# Altium footprint library IDC座子10-64PIN.PcbLib: 24 footprints (part 2 of 2)
Each footprint in its own frame and in the unit in brackets; x right, y up, seen from the top. Pads: shape width x height; smd on the part's side, far side on the other; paste and mask are expansions set on the pad; w line width, h text height; cw(c..) or ccw(c..) is an arc to the next point about the centre after c.
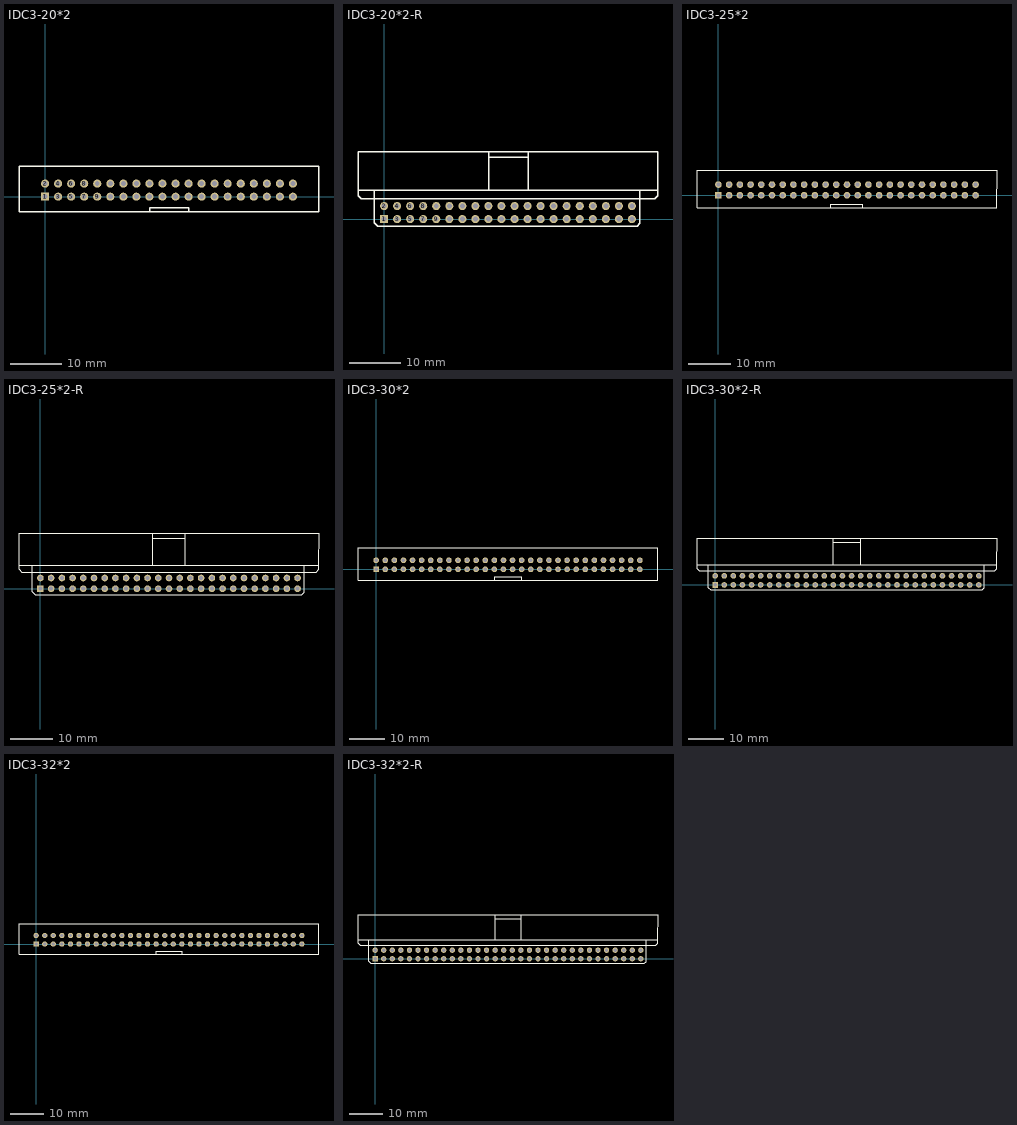
[diagram p1: the footprints below, top view; thin cyan lines are the x and y axes]

## IDC3-20*2 [mil]
pads (40):
  rect 62x62 hole 38: 1(0,0)
  round 62 hole 38: 2(0,100) 3(100,0) 4(100,100) 5(200,0) 6(200,100) 7(300,0) 8(300,100) 9(400,0) 10(400,100) 11(500,0) 12(500,100) 13(600,0) 14(600,100) 15(700,0) 16(700,100) 17(800,0) 18(800,100) 19(900,0) 20(900,100) 21(1000,0) 22(1000,100) 23(1100,0) 24(1100,100) 25(1200,0) 26(1200,100) 27(1300,0) 28(1300,100) 29(1400,0) 30(1400,100) 31(1500,0) 32(1500,100) 33(1600,0) 34(1600,100) 35(1700,0) 36(1700,100) 37(1800,0) 38(1800,100) 39(1900,0) 40(1900,100)
TopOverlay:
  lines w10: 802.76,-116.65 802.76,-85.63 1102.76,-85.63 1102.76,-116.65 ; -200,-117.13 -200,235.24 2100,235.24 2100,-117.13 -200,-117.13
3D body "BH-40.STEP": height 354.33, standoff -133.86, extent -196.97,-117.17 2102.24,237.16

## IDC3-20*2-R [mil]
pads (40):
  rect 62x62 hole 38: 1(0,0)
  round 62 hole 38: 2(0,100) 3(100,0) 4(100,100) 5(200,0) 6(200,100) 7(300,0) 8(300,100) 9(400,0) 10(400,100) 11(500,0) 12(500,100) 13(600,0) 14(600,100) 15(700,0) 16(700,100) 17(800,0) 18(800,100) 19(900,0) 20(900,100) 21(1000,0) 22(1000,100) 23(1100,0) 24(1100,100) 25(1200,0) 26(1200,100) 27(1300,0) 28(1300,100) 29(1400,0) 30(1400,100) 31(1500,0) 32(1500,100) 33(1600,0) 34(1600,100) 35(1700,0) 36(1700,100) 37(1800,0) 38(1800,100) 39(1900,0) 40(1900,100)
TopOverlay:
  lines w8: -76.12,220 -75,218.88
  lines w10: -75,218.88 -75,-30 -50,-55 1940,-55 1961.88,-33.12 1961.88,220 ; 803.74,225.37 803.74,474.41 ; 803.74,515.42 803.74,474.41 ; 1103.74,223.55 1103.74,472.44 ; 1103.74,514.76 1103.74,472.44 ; -200,220 2100,220 ; -200,220 -200,515.75 2100,515.75 2100,220 ; -200,220 -200,180 -175,155 -75,155 961.88,155 2075,155 2100,180 2100,220 ; 803.74,474.41 803.74,472.44 1103.74,472.44
3D body "BH-40R.STEP": height 358.27, standoff -110.24, extent -200,-18.11 2099.21,515.75

## IDC3-25*2 [mil]
pads (50):
  rect 62x62 hole 38: 1(0,0)
  round 62 hole 38: 2(0,100) 3(100,0) 4(100,100) 5(200,0) 6(200,100) 7(300,0) 8(300,100) 9(400,0) 10(400,100) 11(500,0) 12(500,100) 13(600,0) 14(600,100) 15(700,0) 16(700,100) 17(800,0) 18(800,100) 19(900,0) 20(900,100) 21(1000,0) 22(1000,100) 23(1100,0) 24(1100,100) 25(1200,0) 26(1200,100) 27(1300,0) 28(1300,100) 29(1400,0) 30(1400,100) 31(1500,0) 32(1500,100) 33(1600,0) 34(1600,100) 35(1700,0) 36(1700,100) 37(1800,0) 38(1800,100) 39(1900,0) 40(1900,100) 41(2000,0) 42(2000,100) 43(2100,0) 44(2100,100) 45(2200,0) 46(2200,100) 47(2300,0) 48(2300,100) 49(2400,0) 50(2400,100)
TopOverlay:
  lines w10: 1048.82,-114.69 1048.82,-83.66 1348.82,-83.66 1348.82,-114.68 ; -200,-117.13 2600,-117.13 2600,235.24 -200,235.24 -200,-117.13
3D body "BH-50.STEP": height 354.33, standoff -133.86, extent -200.78,-117.13 2598.43,237.2

## IDC3-25*2-R [mil]
pads (50):
  rect 62x62 hole 38: 1(0,0)
  round 62 hole 38: 2(0,100) 3(100,0) 4(100,100) 5(200,0) 6(200,100) 7(300,0) 8(300,100) 9(400,0) 10(400,100) 11(500,0) 12(500,100) 13(600,0) 14(600,100) 15(700,0) 16(700,100) 17(800,0) 18(800,100) 19(900,0) 20(900,100) 21(1000,0) 22(1000,100) 23(1100,0) 24(1100,100) 25(1200,0) 26(1200,100) 27(1300,0) 28(1300,100) 29(1400,0) 30(1400,100) 31(1500,0) 32(1500,100) 33(1600,0) 34(1600,100) 35(1700,0) 36(1700,100) 37(1800,0) 38(1800,100) 39(1900,0) 40(1900,100) 41(2000,0) 42(2000,100) 43(2100,0) 44(2100,100) 45(2200,0) 46(2200,100) 47(2300,0) 48(2300,100) 49(2400,0) 50(2400,100)
TopOverlay:
  lines w8: -76.12,220 -75,218.88
  lines w10: -75,218.88 -75,-30 -50,-55 2440,-55 2461.88,-33.12 2461.88,220 ; 1050,223.4 1050,472.44 ; 1050,513.45 1050,472.44 ; 1350,221.58 1350,470.47 ; 1350,512.8 1350,470.47 ; -200,220 2600,220 ; -200,220 -200,515.75 2600,515.75 2600,220 ; -200,220 -200,180 -175,155 -75,155 961.88,155 2575,155 2600,180 2600,220 ; 1050,472.44 1050,470.47 1350,470.47
3D body "BH-50R.STEP": height 358.27, standoff -110.24, extent -199.21,-18.11 2600,515.75

## IDC3-30*2 [mil]
pads (60):
  rect 62x62 hole 38: 1(0,0)
  round 62 hole 38: 2(0,100) 3(100,0) 4(100,100) 5(200,0) 6(200,100) 7(300,0) 8(300,100) 9(400,0) 10(400,100) 11(500,0) 12(500,100) 13(600,0) 14(600,100) 15(700,0) 16(700,100) 17(800,0) 18(800,100) 19(900,0) 20(900,100) 21(1000,0) 22(1000,100) 23(1100,0) 24(1100,100) 25(1200,0) 26(1200,100) 27(1300,0) 28(1300,100) 29(1400,0) 30(1400,100) 31(1500,0) 32(1500,100) 33(1600,0) 34(1600,100) 35(1700,0) 36(1700,100) 37(1800,0) 38(1800,100) 39(1900,0) 40(1900,100) 41(2000,0) 42(2000,100) 43(2100,0) 44(2100,100) 45(2200,0) 46(2200,100) 47(2300,0) 48(2300,100) 49(2400,0) 50(2400,100) 51(2500,0) 52(2500,100) 53(2600,0) 54(2600,100) 55(2700,0) 56(2700,100) 57(2800,0) 58(2800,100) 59(2900,0) 60(2900,100)
TopOverlay:
  lines w10: 1303.59,-114.39 1303.59,-83.37 1603.59,-83.37 1603.59,-114.39 ; -200,-117.13 3100,-117.13 3100,235.24 -200,235.24 -200,-117.13
3D body "BH-60.STEP": height 354.33, standoff -133.86, extent -199.21,-117.13 3100,237.2

## IDC3-30*2-R [mil]
pads (60):
  rect 62x62 hole 38: 1(0,0)
  round 62 hole 38: 2(0,100) 3(100,0) 4(100,100) 5(200,0) 6(200,100) 7(300,0) 8(300,100) 9(400,0) 10(400,100) 11(500,0) 12(500,100) 13(600,0) 14(600,100) 15(700,0) 16(700,100) 17(800,0) 18(800,100) 19(900,0) 20(900,100) 21(1000,0) 22(1000,100) 23(1100,0) 24(1100,100) 25(1200,0) 26(1200,100) 27(1300,0) 28(1300,100) 29(1400,0) 30(1400,100) 31(1500,0) 32(1500,100) 33(1600,0) 34(1600,100) 35(1700,0) 36(1700,100) 37(1800,0) 38(1800,100) 39(1900,0) 40(1900,100) 41(2000,0) 42(2000,100) 43(2100,0) 44(2100,100) 45(2200,0) 46(2200,100) 47(2300,0) 48(2300,100) 49(2400,0) 50(2400,100) 51(2500,0) 52(2500,100) 53(2600,0) 54(2600,100) 55(2700,0) 56(2700,100) 57(2800,0) 58(2800,100) 59(2900,0) 60(2900,100)
TopOverlay:
  lines w8: -76.12,220 -75,218.88
  lines w10: -75,218.88 -75,-30 -50,-55 2940,-55 2961.88,-33.12 2961.88,220 ; 1300.79,224.39 1300.79,473.43 ; 1300.79,514.43 1300.79,473.43 ; 1600.79,222.56 1600.79,471.46 ; 1600.79,513.78 1600.79,471.46 ; -200,220 3100,220 ; -200,220 -200,515.75 3100,515.75 3100,220 ; -200,220 -200,180 -175,155 -75,155 961.88,155 3075,155 3100,180 3100,220 ; 1300.79,473.43 1300.79,471.46 1600.79,471.46
3D body "BH-60R.STEP": height 358.27, standoff -110.24, extent -199.21,-18.11 3100,515.75

## IDC3-32*2 [mil]
pads (64):
  rect 62x62 hole 38: 1(0,0)
  round 62 hole 38: 2(0,100) 3(100,0) 4(100,100) 5(200,0) 6(200,100) 7(300,0) 8(300,100) 9(400,0) 10(400,100) 11(500,0) 12(500,100) 13(600,0) 14(600,100) 15(700,0) 16(700,100) 17(800,0) 18(800,100) 19(900,0) 20(900,100) 21(1000,0) 22(1000,100) 23(1100,0) 24(1100,100) 25(1200,0) 26(1200,100) 27(1300,0) 28(1300,100) 29(1400,0) 30(1400,100) 31(1500,0) 32(1500,100) 33(1600,0) 34(1600,100) 35(1700,0) 36(1700,100) 37(1800,0) 38(1800,100) 39(1900,0) 40(1900,100) 41(2000,0) 42(2000,100) 43(2100,0) 44(2100,100) 45(2200,0) 46(2200,100) 47(2300,0) 48(2300,100) 49(2400,0) 50(2400,100) 51(2500,0) 52(2500,100) 53(2600,0) 54(2600,100) 55(2700,0) 56(2700,100) 57(2800,0) 58(2800,100) 59(2900,0) 60(2900,100) 61(3000,0) 62(3000,100) 63(3100,0) 64(3100,100)
TopOverlay:
  lines w10: 1402.17,-114.69 1402.17,-83.66 1702.17,-83.66 1702.17,-114.68 ; -200,-117.13 -200,235.24 3300,235.24 3300,-117.13 -200,-117.13
3D body "BH-64.STEP": height 354.33, standoff -133.86, extent -200,-120.08 3300,234.25

## IDC3-32*2-R [mil]
pads (64):
  rect 62x62 hole 38: 1(0,0)
  round 62 hole 38: 2(0,100) 3(100,0) 4(100,100) 5(200,0) 6(200,100) 7(300,0) 8(300,100) 9(400,0) 10(400,100) 11(500,0) 12(500,100) 13(600,0) 14(600,100) 15(700,0) 16(700,100) 17(800,0) 18(800,100) 19(900,0) 20(900,100) 21(1000,0) 22(1000,100) 23(1100,0) 24(1100,100) 25(1200,0) 26(1200,100) 27(1300,0) 28(1300,100) 29(1400,0) 30(1400,100) 31(1500,0) 32(1500,100) 33(1600,0) 34(1600,100) 35(1700,0) 36(1700,100) 37(1800,0) 38(1800,100) 39(1900,0) 40(1900,100) 41(2000,0) 42(2000,100) 43(2100,0) 44(2100,100) 45(2200,0) 46(2200,100) 47(2300,0) 48(2300,100) 49(2400,0) 50(2400,100) 51(2500,0) 52(2500,100) 53(2600,0) 54(2600,100) 55(2700,0) 56(2700,100) 57(2800,0) 58(2800,100) 59(2900,0) 60(2900,100) 61(3000,0) 62(3000,100) 63(3100,0) 64(3100,100)
TopOverlay:
  lines w8: -76.12,220 -75,218.88
  lines w10: -75,218.88 -75,-30 -50,-55 3140,-55 3161.88,-33.12 3161.88,220 ; 1402.17,222.42 1402.17,471.46 ; 1402.17,512.46 1402.17,471.46 ; 1702.17,220.59 1702.17,469.49 ; 1702.17,511.81 1702.17,469.49 ; -200,220 -200,180 -175,155 -75,155 961.88,155 3275,155 3300,180 3300,220 ; -200,220 -200,515.75 3300,515.75 3300,220 ; -200,220 3300,220 ; 1402.17,471.46 1402.17,469.49 1702.17,469.49
3D body "BH-64R.STEP": height 358.27, standoff -110.24, extent -200,-18.11 3300,515.75